# Altium footprint library Molex FFC - FPC Connectors (SMT).PcbLib: 638 footprints (part 10 of 40)
Each footprint in its own frame and in the unit in brackets; x right, y up, seen from the top. Pads: shape width x height; smd on the part's side, far side on the other; paste and mask are expansions set on the pad; w line width, h text height; cw(c..) or ccw(c..) is an arc to the next point about the centre after c.
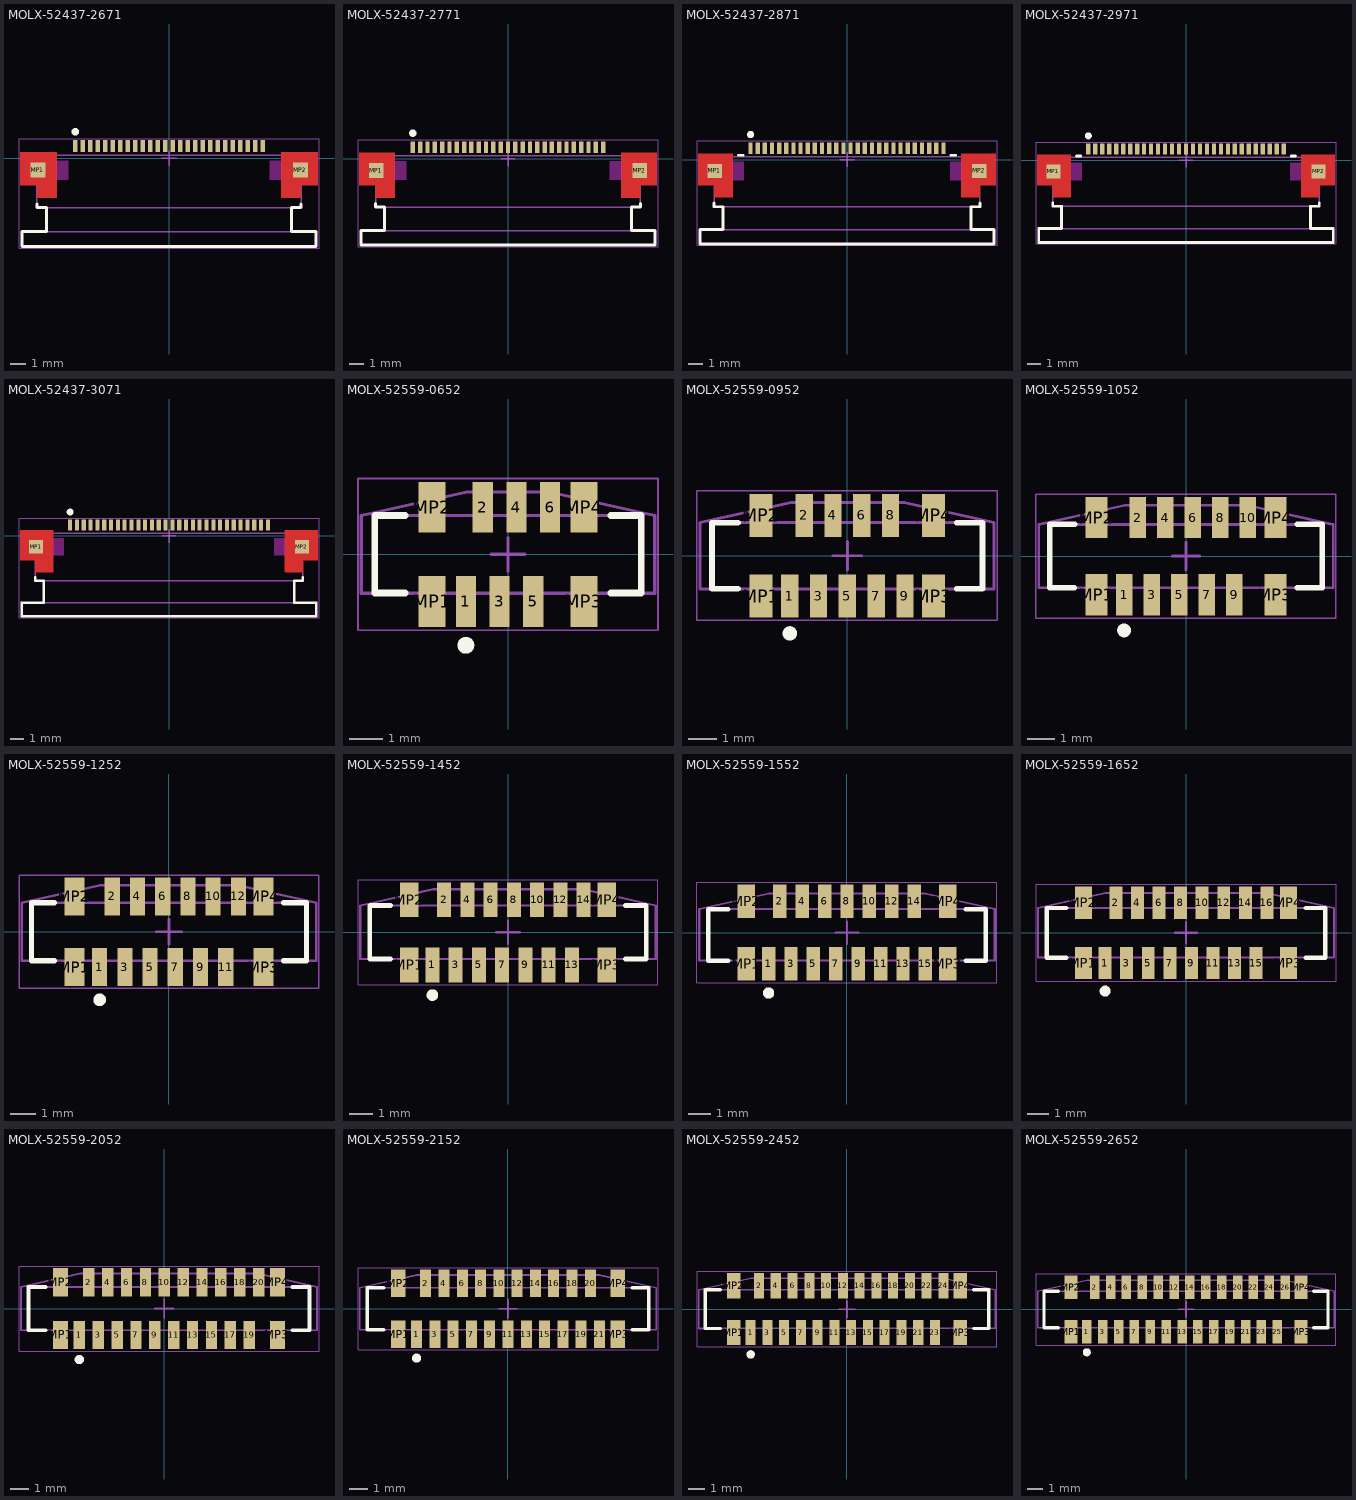
[diagram p9: the footprints below, top view; thin cyan lines are the x and y axes]

## MOLX-52437-2671 [mm] "FPC Connector, 26-Leads, Right Angle, Pitch 0.5 mm, SMT"
height 2.052
pads (28):
  rect 0.3x0.8 smd: 1(-6.25,0.8) 2(-5.75,0.8) 3(-5.25,0.8) 4(-4.75,0.8) 5(-4.25,0.8) 6(-3.75,0.8) 7(-3.25,0.8) 8(-2.75,0.8) 9(-2.25,0.8) 10(-1.75,0.8) 11(-1.25,0.8) 12(-0.75,0.8) 13(-0.25,0.8) 14(0.25,0.8) 15(0.75,0.8) 16(1.25,0.8) 17(1.75,0.8) 18(2.25,0.8) 19(2.75,0.8) 20(3.25,0.8) 21(3.75,0.8) 22(4.25,0.8) 23(4.75,0.8) 24(5.25,0.8) 25(5.75,0.8) 26(6.25,0.8)
  rect 1x1 smd: MP1(-8.75,-0.8) MP2(8.75,-0.8)
Top Layer:
  region: -7.5,0.4 -9.9,0.4 -9.9,-1.8 -8.8,-1.8 -8.8,-2.65 -7.5,-2.65
  region: 7.5,0.4 9.9,0.4 9.9,-1.8 8.8,-1.8 8.8,-2.65 7.5,-2.65
Top Overlay:
  circle w0.25: c-6.25,1.75 r0.125
  lines w0.2: -8.801,-3.05 -8.801,-3.3 -8.181,-3.3 -8.181,-4.9 -9.8,-4.9 ; 8.8,-3.05 8.8,-3.3 8.179,-3.3 8.179,-4.9 9.8,-4.9 ; -9.8,-4.9 -9.8,-5.9 9.8,-5.9 9.8,-4.9 ; -9.8,-4.9 -9.8,-4.9 ; 9.8,-4.9 9.8,-4.9
Keep-Out Layer:
  region: -6.7,-0.15 -7.5,-0.15 -7.5,-1.45 -6.7,-1.45
  rectangle: 6.7,-1.45 7.5,-0.15
Mechanical 13:
  lines w0.1: -8.181,-3.3 -8.181,-4.9 ; -8.181,-4.9 8.179,-4.9 ; -8.181,-4.9 -9.8,-4.9 -9.8,-5.9 9.8,-5.9 9.8,-4.9 8.179,-4.9 ; 8.179,-4.9 8.179,-3.3 ; 8.179,-3.3 -8.181,-3.3 -8.801,-3.3 -8.801,0.2 8.8,0.2 8.8,-3.3 8.179,-3.3
Mechanical 15:
  lines w0.05: -10,-6 -10,1.3 10,1.3 10,-6 -10,-6
  lines w0.1: -0.5,0 0.5,0 ; 0,-0.5 0,0.5
3D body: height 0.25, standoff 0, extent -9.8,-5.9 9.8,0.9

## MOLX-52437-2771 [mm] "FPC Connector, 27-Leads, Right Angle, Pitch 0.5 mm, SMT"
height 2.052
pads (29):
  rect 0.3x0.8 smd: 1(-6.5,0.8) 2(-6,0.8) 3(-5.5,0.8) 4(-5,0.8) 5(-4.5,0.8) 6(-4,0.8) 7(-3.5,0.8) 8(-3,0.8) 9(-2.5,0.8) 10(-2,0.8) 11(-1.5,0.8) 12(-1,0.8) 13(-0.5,0.8) 14(0,0.8) 15(0.5,0.8) 16(1,0.8) 17(1.5,0.8) 18(2,0.8) 19(2.5,0.8) 20(3,0.8) 21(3.5,0.8) 22(4,0.8) 23(4.5,0.8) 24(5,0.8) 25(5.5,0.8) 26(6,0.8) 27(6.5,0.8)
  rect 1x1 smd: MP1(-9,-0.8) MP2(9,-0.8)
Top Layer:
  region: -7.75,0.4 -10.15,0.4 -10.15,-1.8 -9.05,-1.8 -9.05,-2.65 -7.75,-2.65
  region: 7.75,0.4 10.15,0.4 10.15,-1.8 9.05,-1.8 9.05,-2.65 7.75,-2.65
Top Overlay:
  circle w0.25: c-6.5,1.75 r0.125
  lines w0.2: -9.051,-3.05 -9.051,-3.3 -8.431,-3.3 -8.431,-4.9 -10.05,-4.9 -10.05,-4.9 -10.05,-5.9 10.05,-5.9 10.05,-4.9 ; 9.05,-3.05 9.05,-3.3 8.429,-3.3 8.429,-4.9 10.05,-4.9 ; 10.05,-4.9 10.05,-4.9
Keep-Out Layer:
  region: -6.95,-0.15 -7.75,-0.15 -7.75,-1.45 -6.95,-1.45
  rectangle: 6.95,-1.45 7.75,-0.15
Mechanical 13:
  lines w0.1: -8.431,-4.9 8.429,-4.9 ; -8.431,-4.9 -8.431,-3.3 ; -8.431,-4.9 -10.05,-4.9 -10.05,-5.9 10.05,-5.9 10.05,-4.9 8.429,-4.9 ; -8.431,-3.3 8.429,-3.3 ; -8.431,-3.3 -9.051,-3.3 -9.051,0.2 9.05,0.2 9.05,-3.3 8.429,-3.3 ; 8.429,-4.9 8.429,-3.3
Mechanical 15:
  lines w0.05: -10.25,-6 -10.25,1.3 10.25,1.3 10.25,-6 -10.25,-6
  lines w0.1: -0.5,0 0.5,0 ; 0,-0.5 0,0.5
3D body: height 0.25, standoff 0, extent -10.05,-5.9 10.05,0.9

## MOLX-52437-2871 [mm] "FPC Connector, 28-Leads, Right Angle, Pitch 0.5 mm, SMT"
height 2.052
pads (30):
  rect 0.3x0.8 smd: 1(-6.75,0.8) 2(-6.25,0.8) 3(-5.75,0.8) 4(-5.25,0.8) 5(-4.75,0.8) 6(-4.25,0.8) 7(-3.75,0.8) 8(-3.25,0.8) 9(-2.75,0.8) 10(-2.25,0.8) 11(-1.75,0.8) 12(-1.25,0.8) 13(-0.75,0.8) 14(-0.25,0.8) 15(0.25,0.8) 16(0.75,0.8) 17(1.25,0.8) 18(1.75,0.8) 19(2.25,0.8) 20(2.75,0.8) 21(3.25,0.8) 22(3.75,0.8) 23(4.25,0.8) 24(4.75,0.8) 25(5.25,0.8) 26(5.75,0.8) 27(6.25,0.8) 28(6.75,0.8)
  rect 1x1 smd: MP1(-9.25,-0.8) MP2(9.25,-0.8)
Top Layer:
  region: 8,0.4 10.4,0.4 10.4,-1.8 9.3,-1.8 9.3,-2.65 8,-2.65
  region: -8,0.4 -10.4,0.4 -10.4,-1.8 -9.3,-1.8 -9.3,-2.65 -8,-2.65
Top Overlay:
  circle w0.25: c-6.75,1.75 r0.125
  lines w0.2: -9.301,-3.05 -9.301,-3.3 -8.681,-3.3 -8.681,-4.9 -10.3,-4.9 ; -7.6,0.3 -7.288,0.3 ; 7.287,0.3 7.6,0.3 ; 9.3,-3.05 9.3,-3.3 8.679,-3.3 8.679,-4.9 10.3,-4.9 ; -10.3,-4.9 -10.3,-4.9 ; -10.3,-4.9 -10.3,-5.9 10.3,-5.9 10.3,-4.9 ; 10.3,-4.9 10.3,-4.9
Keep-Out Layer:
  rectangle: 7.2,-1.45 8,-0.15
  region: -7.2,-0.15 -8,-0.15 -8,-1.45 -7.2,-1.45
Mechanical 13:
  lines w0.1: -8.681,-4.9 -10.3,-4.9 -10.3,-5.9 10.3,-5.9 10.3,-4.9 8.679,-4.9 ; -8.681,-4.9 -8.681,-3.3 ; -8.681,-4.9 8.679,-4.9 ; -8.681,-3.3 -9.301,-3.3 -9.301,0.2 9.3,0.2 9.3,-3.3 8.679,-3.3 ; -8.681,-3.3 8.679,-3.3 ; 8.679,-4.9 8.679,-3.3
Mechanical 15:
  lines w0.05: -10.5,-6 10.5,-6 10.5,1.3 -10.5,1.3 -10.5,-6
  lines w0.1: -0.5,0 0.5,0 ; 0,-0.5 0,0.5
3D body: height 0.25, standoff 0, extent -10.3,-5.9 10.3,0.9

## MOLX-52437-2971 [mm] "FPC Connector, 29-Leads, Right Angle, Pitch 0.5 mm, SMT"
height 2.052
pads (31):
  rect 0.3x0.8 smd: 1(-7,0.8) 2(-6.5,0.8) 3(-6,0.8) 4(-5.5,0.8) 5(-5,0.8) 6(-4.5,0.8) 7(-4,0.8) 8(-3.5,0.8) 9(-3,0.8) 10(-2.5,0.8) 11(-2,0.8) 12(-1.5,0.8) 13(-1,0.8) 14(-0.5,0.8) 15(0,0.8) 16(0.5,0.8) 17(1,0.8) 18(1.5,0.8) 19(2,0.8) 20(2.5,0.8) 21(3,0.8) 22(3.5,0.8) 23(4,0.8) 24(4.5,0.8) 25(5,0.8) 26(5.5,0.8) 27(6,0.8) 28(6.5,0.8) 29(7,0.8)
  rect 1x1 smd: MP1(-9.5,-0.8) MP2(9.5,-0.8)
Top Layer:
  region: -8.25,0.4 -10.65,0.4 -10.65,-1.8 -9.55,-1.8 -9.55,-2.65 -8.25,-2.65
  region: 8.25,0.4 10.65,0.4 10.65,-1.8 9.55,-1.8 9.55,-2.65 8.25,-2.65
Top Overlay:
  circle w0.25: c-7,1.75 r0.125
  lines w0.2: -9.551,-3.05 -9.551,-3.3 -8.931,-3.3 -8.931,-4.9 -10.55,-4.9 ; -7.85,0.3 -7.538,0.3 ; 7.537,0.3 7.85,0.3 ; 9.55,-3.05 9.55,-3.3 8.929,-3.3 8.929,-4.9 10.55,-4.9 ; -10.55,-4.9 -10.55,-5.9 10.55,-5.9 10.55,-4.9 ; -10.55,-4.9 -10.55,-4.9 ; 10.55,-4.9 10.55,-4.9
Keep-Out Layer:
  region: -7.45,-0.15 -8.25,-0.15 -8.25,-1.45 -7.45,-1.45
  rectangle: 7.45,-1.45 8.25,-0.15
Mechanical 13:
  lines w0.1: 9,-4.9 -8.931,-4.9 ; -8.931,-4.9 -8.931,-3.3 ; -8.931,-4.9 -10.55,-4.9 -10.55,-5.9 10.55,-5.9 10.55,-4.9 8.929,-4.9 8.929,-3.3 ; -8.931,-3.3 8.929,-3.3 ; -8.931,-3.3 -9.551,-3.3 -9.551,0.2 9.55,0.2 9.55,-3.3 8.929,-3.3
Mechanical 15:
  lines w0.05: -10.75,-6 -10.75,1.3 10.75,1.3 10.75,-6 -10.75,-6
  lines w0.1: -0.5,0 0.5,0 ; 0,-0.5 0,0.5
3D body: height 0.25, standoff 0, extent -10.55,-5.9 10.55,0.9

## MOLX-52437-3071 [mm] "FPC Connector, 30-Leads, Right Angle, Pitch 0.5 mm, SMT"
height 2.052
pads (32):
  rect 0.3x0.8 smd: 1(-7.25,0.8) 2(-6.75,0.8) 3(-6.25,0.8) 4(-5.75,0.8) 5(-5.25,0.8) 6(-4.75,0.8) 7(-4.25,0.8) 8(-3.75,0.8) 9(-3.25,0.8) 10(-2.75,0.8) 11(-2.25,0.8) 12(-1.75,0.8) 13(-1.25,0.8) 14(-0.75,0.8) 15(-0.25,0.8) 16(0.25,0.8) 17(0.75,0.8) 18(1.25,0.8) 19(1.75,0.8) 20(2.25,0.8) 21(2.75,0.8) 22(3.25,0.8) 23(3.75,0.8) 24(4.25,0.8) 25(4.75,0.8) 26(5.25,0.8) 27(5.75,0.8) 28(6.25,0.8) 29(6.75,0.8) 30(7.25,0.8)
  rect 1x1 smd: MP1(-9.75,-0.8) MP2(9.75,-0.8)
Top Layer:
  region: -8.5,0.4 -10.9,0.4 -10.9,-1.8 -9.8,-1.8 -9.8,-2.65 -8.5,-2.65
  region: 8.5,0.4 10.9,0.4 10.9,-1.8 9.8,-1.8 9.8,-2.65 8.5,-2.65
Top Overlay:
  circle w0.25: c-7.25,1.75 r0.125
  lines w0.2: -9.801,-3.05 -9.801,-3.3 -9.181,-3.3 -9.181,-4.9 -10.8,-4.9 ; 9.8,-3.05 9.8,-3.3 9.179,-3.3 9.179,-4.9 10.8,-4.9 ; -10.8,-4.9 -10.8,-5.9 10.8,-5.9 10.8,-4.9 ; -10.8,-4.9 -10.8,-4.9 ; 10.8,-4.9 10.8,-4.9
Keep-Out Layer:
  region: -7.7,-0.15 -8.5,-0.15 -8.5,-1.45 -7.7,-1.45
  rectangle: 7.7,-1.45 8.5,-0.15
Mechanical 13:
  lines w0.1: -9.181,-4.9 9.179,-4.9 ; -9.181,-4.9 -9.181,-3.3 ; -9.181,-4.9 -10.8,-4.9 -10.8,-5.9 10.8,-5.9 10.8,-4.9 9.179,-4.9 ; -9.181,-3.3 9.179,-3.3 ; -9.181,-3.3 -9.801,-3.3 -9.801,0.2 9.8,0.2 9.8,-3.3 9.179,-3.3 ; 9.179,-4.9 9.179,-3.3
Mechanical 15:
  lines w0.05: -11,-6 -11,1.3 11,1.3 11,-6 -11,-6
  lines w0.1: -0.5,0 0.5,0 ; 0,-0.5 0,0.5
3D body: height 0.25, standoff 0, extent -10.8,-5.9 10.8,0.9

## MOLX-52559-0652 [mm] "FPC Connector, 6-Leads, Vertical, Pitch 0.5 mm, Mated Height 3.9 mm, SMT"
height 5.3
pads (10):
  rect 0.6x1.5 smd: 1(-1.25,-1.4) 2(-0.75,1.4) 3(-0.25,-1.4) 4(0.25,1.4) 5(0.75,-1.4) 6(1.25,1.4)
  rect 0.8x1.5 smd: MP1(-2.25,-1.4) MP2(-2.25,1.4) MP3(2.25,-1.4) MP4(2.25,1.4)
Top Overlay:
  circle w0.25: c-1.25,-2.7 r0.125
  lines w0.2: -3.05,-1.15 -3.95,-1.15 -3.95,1.15 -3.05,1.15 ; 3.05,-1.15 3.95,-1.15 3.95,1.15 3.05,1.15
Mechanical 13:
  lines w0.1: -3.95,-1.15 -3.95,1.15 3.95,1.15 3.95,-1.15 ; -4.35,-1.15 -4.35,1.15 -1.225,1.85 1.225,1.85 4.35,1.15 4.35,-1.15 1.8,-1.15 -1.8,-1.15 -4.35,-1.15
Mechanical 15:
  lines w0.05: -4.45,-2.25 4.45,-2.25 4.45,2.25 -4.45,2.25 -4.45,-2.25
  lines w0.1: -0.5,0 0.5,0 ; 0,-0.5 0,0.5
3D body: height 0.25, standoff 0, extent -4.35,-1.65 4.35,1.85

## MOLX-52559-0952 [mm] "FPC Connector, 9-Leads, Vertical, Pitch 0.5 mm, Mated Height 3.9 mm, SMT"
height 5.3
pads (13):
  rect 0.6x1.5 smd: 1(-2,-1.4) 2(-1.5,1.4) 3(-1,-1.4) 4(-0.5,1.4) 5(0,-1.4) 6(0.5,1.4) 7(1,-1.4) 8(1.5,1.4) 9(2,-1.4)
  rect 0.8x1.5 smd: MP1(-3,-1.4) MP2(-3,1.4) MP3(3,-1.4) MP4(3,1.4)
Top Overlay:
  circle w0.25: c-2,-2.7 r0.125
  lines w0.2: -3.8,-1.15 -4.7,-1.15 -4.7,1.15 -3.8,1.15 ; 3.8,-1.15 4.7,-1.15 4.7,1.15 3.8,1.15
Mechanical 13:
  lines w0.1: -4.7,-1.15 -4.7,1.15 4.7,1.15 4.7,-1.15 ; 2.575,-1.15 2.575,-1.15 ; 2.575,-1.15 5.1,-1.15 5.1,1.15 1.975,1.85 -1.95,1.85 -5.125,1.15 -5.125,-1.15 -2.6,-1.15 2.575,-1.15
Mechanical 15:
  lines w0.05: -5.225,-2.25 5.2,-2.25 5.2,2.25 -5.225,2.25 -5.225,-2.25
  lines w0.1: -0.5,0 0.5,0 ; 0,-0.5 0,0.5
3D body: height 0.25, standoff 0, extent -5.1,-1.65 5.1,1.85

## MOLX-52559-1052 [mm] "FPC Connector, 10-Leads, Vertical, Pitch 0.5 mm, Mated Height 3.9 mm, SMT"
height 5.3
pads (14):
  rect 0.6x1.5 smd: 1(-2.25,-1.4) 2(-1.75,1.4) 3(-1.25,-1.4) 4(-0.75,1.4) 5(-0.25,-1.4) 6(0.25,1.4) 7(0.75,-1.4) 8(1.25,1.4) 9(1.75,-1.4) 10(2.25,1.4)
  rect 0.8x1.5 smd: MP1(-3.25,-1.4) MP2(-3.25,1.4) MP3(3.25,-1.4) MP4(3.25,1.4)
Top Overlay:
  circle w0.25: c-2.25,-2.7 r0.125
  lines w0.2: -4.95,-1.152 -4.054,-1.152 ; -4.95,-1.15 -4.95,1.15 ; -4.95,1.15 -4.05,1.15 ; 4.05,-1.15 4.95,-1.15 4.95,1.15 ; 4.05,1.15 4.95,1.15
Mechanical 13:
  lines w0.1: -4.95,-1.15 -4.95,1.15 4.95,1.15 4.95,-1.147 ; -5.35,-1.15 -2.823,-1.16 2.82,-1.15 5.35,-1.15 5.35,1.15 2.225,1.85 -2.225,1.85 -5.35,1.15 -5.35,-1.15
Mechanical 15:
  lines w0.05: -5.45,-2.25 5.45,-2.25 5.45,2.25 -5.45,2.25 -5.45,-2.25
  lines w0.1: -0.5,0 0.5,0 ; 0,-0.5 0,0.5
3D body: height 0.25, standoff 0, extent -5.35,-1.65 5.35,1.85

## MOLX-52559-1252 [mm] "FPC Connector, 12-Leads, Vertical, Pitch 0.5 mm, Mated Height 3.9 mm, SMT"
height 5.3
pads (16):
  rect 0.6x1.5 smd: 1(-2.75,-1.4) 2(-2.25,1.4) 3(-1.75,-1.4) 4(-1.25,1.4) 5(-0.75,-1.4) 6(-0.25,1.4) 7(0.25,-1.4) 8(0.75,1.4) 9(1.25,-1.4) 10(1.75,1.4) 11(2.25,-1.4) 12(2.75,1.4)
  rect 0.8x1.5 smd: MP1(-3.75,-1.4) MP2(-3.75,1.4) MP3(3.75,-1.4) MP4(3.75,1.4)
Top Overlay:
  circle w0.25: c-2.75,-2.7 r0.125
  lines w0.2: -4.55,-1.15 -5.45,-1.15 -5.45,1.15 -4.55,1.15 ; 4.55,-1.15 5.45,-1.15 5.45,1.15 4.55,1.15
Mechanical 13:
  lines w0.1: -5.45,-1.15 -5.45,1.15 5.45,1.15 5.45,-1.15 ; -5.85,-1.15 5.85,-1.15 5.85,1.15 2.725,1.85 -2.725,1.85 -5.85,1.15 -5.85,-1.15
Mechanical 15:
  lines w0.05: -5.95,-2.25 -5.95,2.25 5.95,2.25 5.95,-2.25 -5.95,-2.25
  lines w0.1: -0.5,0 0.5,0 ; 0,-0.5 0,0.5
3D body: height 0.25, standoff 0, extent -5.85,-1.65 5.85,1.85

## MOLX-52559-1452 [mm] "FPC Connector, 14-Leads, Vertical, Pitch 0.5 mm, Mated Height 3.9 mm, SMT"
height 5.3
pads (18):
  rect 0.6x1.5 smd: 1(-3.25,-1.4) 2(-2.75,1.4) 3(-2.25,-1.4) 4(-1.75,1.4) 5(-1.25,-1.4) 6(-0.75,1.4) 7(-0.25,-1.4) 8(0.25,1.4) 9(0.75,-1.4) 10(1.25,1.4) 11(1.75,-1.4) 12(2.25,1.4) 13(2.75,-1.4) 14(3.25,1.4)
  rect 0.8x1.5 smd: MP1(-4.25,-1.4) MP2(-4.25,1.4) MP3(4.25,-1.4) MP4(4.25,1.4)
Top Overlay:
  circle w0.25: c-3.25,-2.7 r0.125
  lines w0.2: -5.05,-1.15 -5.95,-1.15 -5.95,1.15 -5.05,1.15 ; 5.05,-1.15 5.95,-1.15 5.95,1.143 ; 5.05,1.15 5.95,1.15
Mechanical 13:
  lines w0.1: -5.95,-1.15 -5.95,1.15 ; -5.943,1.15 5.95,1.15 5.95,-1.15 ; -6.35,-1.15 -6.35,1.15 -3.225,1.85 3.225,1.85 6.35,1.15 6.35,-1.15 -6.35,-1.15
Mechanical 15:
  lines w0.05: -6.45,-2.25 -6.45,2.25 6.45,2.25 6.45,-2.25 -6.45,-2.25
  lines w0.1: -0.5,0 0.5,0 ; 0,-0.5 0,0.5
3D body: height 0.25, standoff 0, extent -6.35,-1.65 6.35,1.85

## MOLX-52559-1552 [mm] "FPC Connector, 15-Leads, Vertical, Pitch 0.5 mm, Mated Height 3.9 mm, SMT"
height 5.3
pads (19):
  rect 0.6x1.5 smd: 1(-3.5,-1.4) 2(-3,1.4) 3(-2.5,-1.4) 4(-2,1.4) 5(-1.5,-1.4) 6(-1,1.4) 7(-0.5,-1.4) 8(0,1.4) 9(0.5,-1.4) 10(1,1.4) 11(1.5,-1.4) 12(2,1.4) 13(2.5,-1.4) 14(3,1.4) 15(3.5,-1.4)
  rect 0.8x1.5 smd: MP1(-4.5,-1.4) MP2(-4.5,1.4) MP3(4.5,-1.4) MP4(4.5,1.4)
Top Overlay:
  circle w0.25: c-3.5,-2.7 r0.125
  lines w0.2: -5.3,-1.25 -6.2,-1.25 -6.2,1.05 -5.3,1.05 ; 5.3,-1.25 6.2,-1.25 6.2,1.05 5.3,1.05
Mechanical 13:
  lines w0.1: -6.2,-1.25 -6.2,1.05 6.2,1.05 6.2,-1.25 ; -6.6,-1.25 -4.075,-1.25 4.075,-1.25 6.6,-1.25 6.6,1.05 3.475,1.75 -3.475,1.75 -6.6,1.05 -6.6,-1.25
Mechanical 15:
  lines w0.05: -6.7,-2.25 6.7,-2.25 6.7,2.25 -6.7,2.25 -6.7,-2.25
  lines w0.1: -0.5,0 0.5,0 ; 0,-0.5 0,0.5
3D body: height 0.25, standoff 0, extent -6.6,-1.75 6.6,1.75

## MOLX-52559-1652 [mm] "FPC Connector, 16-Leads, Vertical, Pitch 0.5 mm, Mated Height 3.9 mm, SMT"
height 5.3
pads (20):
  rect 0.6x1.5 smd: 1(-3.75,-1.4) 2(-3.25,1.4) 3(-2.75,-1.4) 4(-2.25,1.4) 5(-1.75,-1.4) 6(-1.25,1.4) 7(-0.75,-1.4) 8(-0.25,1.4) 9(0.25,-1.4) 10(0.75,1.4) 11(1.25,-1.4) 12(1.75,1.4) 13(2.25,-1.4) 14(2.75,1.4) 15(3.25,-1.4) 16(3.75,1.4)
  rect 0.8x1.5 smd: MP1(-4.75,-1.4) MP2(-4.75,1.4) MP3(4.75,-1.4) MP4(4.75,1.4)
Top Overlay:
  circle w0.25: c-3.75,-2.7 r0.125
  lines w0.2: -5.55,-1.15 -6.45,-1.15 -6.45,1.15 -5.55,1.15 ; 5.55,-1.15 6.45,-1.15 6.45,1.15 5.55,1.15
Mechanical 13:
  lines w0.1: -6.45,-1.15 -6.45,1.15 6.45,1.15 6.45,-1.15 ; -6.85,-1.15 -4.33,-1.15 4.33,-1.15 6.85,-1.15 6.85,1.15 3.725,1.85 -3.725,1.85 -6.85,1.15 -6.85,-1.15
Mechanical 15:
  lines w0.05: -6.95,-2.25 6.95,-2.25 6.95,2.25 -6.95,2.25 -6.95,-2.25
  lines w0.1: -0.5,0 0.5,0 ; 0,-0.5 0,0.5
3D body: height 0.25, standoff 0, extent -6.85,-1.65 6.85,1.85

## MOLX-52559-2052 [mm] "FPC Connector, 20-Leads, Vertical, Pitch 0.5 mm, Mated Height 3.9 mm, SMT"
height 5.3
pads (24):
  rect 0.6x1.5 smd: 1(-4.5,-1.4) 2(-4,1.4) 3(-3.5,-1.4) 4(-3,1.4) 5(-2.5,-1.4) 6(-2,1.4) 7(-1.5,-1.4) 8(-1,1.4) 9(-0.5,-1.4) 10(0,1.4) 11(0.5,-1.4) 12(1,1.4) 13(1.5,-1.4) 14(2,1.4) 15(2.5,-1.4) 16(3,1.4) 17(3.5,-1.4) 18(4,1.4) 19(4.5,-1.4) 20(5,1.4)
  rect 0.8x1.5 smd: MP1(-5.5,-1.4) MP2(-5.5,1.4) MP3(6,-1.4) MP4(6,1.4)
Top Overlay:
  circle w0.25: c-4.5,-2.7 r0.125
  lines w0.2: -7.2,-1.15 -7.2,1.15 -6.3,1.15 ; -7.2,-1.15 -6.3,-1.15 ; 6.8,-1.15 7.7,-1.15 7.7,1.15 6.8,1.15
Mechanical 13:
  lines w0.1: -7.2,-1.15 -7.2,1.15 7.7,1.15 7.7,-1.15 ; -7.6,-1.15 -7.6,1.15 -4.475,1.85 4.975,1.85 8.1,1.15 8.1,-1.15 5.575,-1.15 -5.075,-1.15 -7.6,-1.15
Mechanical 15:
  lines w0.05: -7.7,-2.25 8.2,-2.25 8.2,2.25 -7.7,2.25 -7.7,-2.25
  lines w0.1: -0.5,0 0.5,0 ; 0,-0.5 0,0.5
3D body: height 0.25, standoff 0, extent -7.6,-1.65 8.1,1.85

## MOLX-52559-2152 [mm] "FPC Connector, 21-Leads, Vertical, Pitch 0.5 mm, Mated Height 3.9 mm, SMT"
height 5.3
pads (25):
  rect 0.6x1.5 smd: 1(-5,-1.4) 2(-4.5,1.4) 3(-4,-1.4) 4(-3.5,1.4) 5(-3,-1.4) 6(-2.5,1.4) 7(-2,-1.4) 8(-1.5,1.4) 9(-1,-1.4) 10(-0.5,1.4) 11(0,-1.4) 12(0.5,1.4) 13(1,-1.4) 14(1.5,1.4) 15(2,-1.4) 16(2.5,1.4) 17(3,-1.4) 18(3.5,1.4) 19(4,-1.4) 20(4.5,1.4) 21(5,-1.4)
  rect 0.8x1.5 smd: MP1(-6,-1.4) MP2(-6,1.4) MP3(6,-1.4) MP4(6,1.4)
Top Overlay:
  circle w0.25: c-5,-2.7 r0.125
  lines w0.2: -7.7,1.15 -7.7,-1.15 -6.8,-1.15 ; -7.7,1.15 -6.8,1.15 ; 6.8,-1.15 7.7,-1.15 7.7,1.15 ; 6.8,1.15 7.7,1.15
Mechanical 13:
  lines w0.1: -7.7,-1.15 -7.7,1.15 7.7,1.15 7.7,-1.15 ; -8.1,-1.15 -5.575,-1.15 5.575,-1.15 8.1,-1.15 8.1,1.15 4.975,1.85 -4.975,1.85 -8.1,1.15 -8.1,-1.15
Mechanical 15:
  lines w0.05: -8.2,-2.25 -8.2,2.25 8.2,2.25 8.2,-2.25 -8.2,-2.25
  lines w0.1: -0.5,0 0.5,0 ; 0,-0.5 0,0.5
3D body: height 0.25, standoff 0, extent -8.1,-1.65 8.1,1.85

## MOLX-52559-2452 [mm] "FPC Connector, 24-Leads, Vertical, Pitch 0.5 mm, Mated Height 3.9 mm, SMT"
height 5.3
pads (28):
  rect 0.6x1.5 smd: 1(-5.75,-1.4) 2(-5.25,1.4) 3(-4.75,-1.4) 4(-4.25,1.4) 5(-3.75,-1.4) 6(-3.25,1.4) 7(-2.75,-1.4) 8(-2.25,1.4) 9(-1.75,-1.4) 10(-1.25,1.4) 11(-0.75,-1.4) 12(-0.25,1.4) 13(0.25,-1.4) 14(0.75,1.4) 15(1.25,-1.4) 16(1.75,1.4) 17(2.25,-1.4) 18(2.75,1.4) 19(3.25,-1.4) 20(3.75,1.4) 21(4.25,-1.4) 22(4.75,1.4) 23(5.25,-1.4) 24(5.75,1.4)
  rect 0.8x1.5 smd: MP1(-6.75,-1.4) MP2(-6.75,1.4) MP3(6.75,-1.4) MP4(6.75,1.4)
Top Overlay:
  circle w0.25: c-5.75,-2.7 r0.125
  lines w0.2: -8.45,1.15 -8.45,-1.15 -7.55,-1.15 ; -8.45,1.15 -7.55,1.15 ; 7.55,-1.15 8.45,-1.15 ; 7.55,1.15 8.45,1.15 ; 8.45,-1.146 8.45,1.15
Mechanical 13:
  lines w0.1: -8.45,-1.15 -8.45,1.15 8.45,1.15 8.45,-1.15 ; -8.85,-1.15 -8.85,1.15 -5.725,1.85 5.725,1.85 8.85,1.15 8.85,-1.15 6.325,-1.125 -6.325,-1.15 -8.85,-1.15
Mechanical 15:
  lines w0.05: -8.95,-2.25 8.95,-2.25 8.95,2.25 -8.95,2.25 -8.95,-2.25
  lines w0.1: -0.5,0 0.5,0 ; 0,-0.5 0,0.5
3D body: height 0.25, standoff 0, extent -8.85,-1.65 8.85,1.85

## MOLX-52559-2652 [mm] "FPC Connector, 26-Leads, Vertical, Pitch 0.5 mm, Mated Height 3.9 mm, SMT"
height 5.3
pads (30):
  rect 0.6x1.5 smd: 1(-6.25,-1.4) 2(-5.75,1.4) 3(-5.25,-1.4) 4(-4.75,1.4) 5(-4.25,-1.4) 6(-3.75,1.4) 7(-3.25,-1.4) 8(-2.75,1.4) 9(-2.25,-1.4) 10(-1.75,1.4) 11(-1.25,-1.4) 12(-0.75,1.4) 13(-0.25,-1.4) 14(0.25,1.4) 15(0.75,-1.4) 16(1.25,1.4) 17(1.75,-1.4) 18(2.25,1.4) 19(2.75,-1.4) 20(3.25,1.4) 21(3.75,-1.4) 22(4.25,1.4) 23(4.75,-1.4) 24(5.25,1.4) 25(5.75,-1.4) 26(6.25,1.4)
  rect 0.8x1.5 smd: MP1(-7.25,-1.4) MP2(-7.25,1.4) MP3(7.25,-1.4) MP4(7.25,1.4)
Top Overlay:
  circle w0.25: c-6.25,-2.7 r0.125
  lines w0.2: -8.05,-1.15 -8.95,-1.15 -8.95,1.15 -8.05,1.15 ; 8.05,-1.15 8.95,-1.15 8.95,1.15 8.05,1.15
Mechanical 13:
  lines w0.1: -8.95,-1.15 -8.95,1.15 8.95,1.15 8.95,-1.15 ; -9.35,-1.15 -6.825,-1.15 6.824,-1.151 9.35,-1.15 9.35,1.15 6.225,1.85 -6.225,1.85 -9.35,1.15 -9.35,-1.15
Mechanical 15:
  lines w0.05: -9.45,-2.25 9.45,-2.25 9.45,2.25 -9.45,2.25 -9.45,-2.25
  lines w0.1: -0.5,0 0.5,0 ; 0,-0.5 0,0.5
3D body: height 0.25, standoff 0, extent -9.35,-1.65 9.35,1.85